# Altium footprint library My Footprint 3D.PCBLIB: 447 footprints (part 11 of 29)
Each footprint in its own frame and in the unit in brackets; x right, y up, seen from the top. Pads: shape width x height; smd on the part's side, far side on the other; paste and mask are expansions set on the pad; w line width, h text height; cw(c..) or ccw(c..) is an arc to the next point about the centre after c.
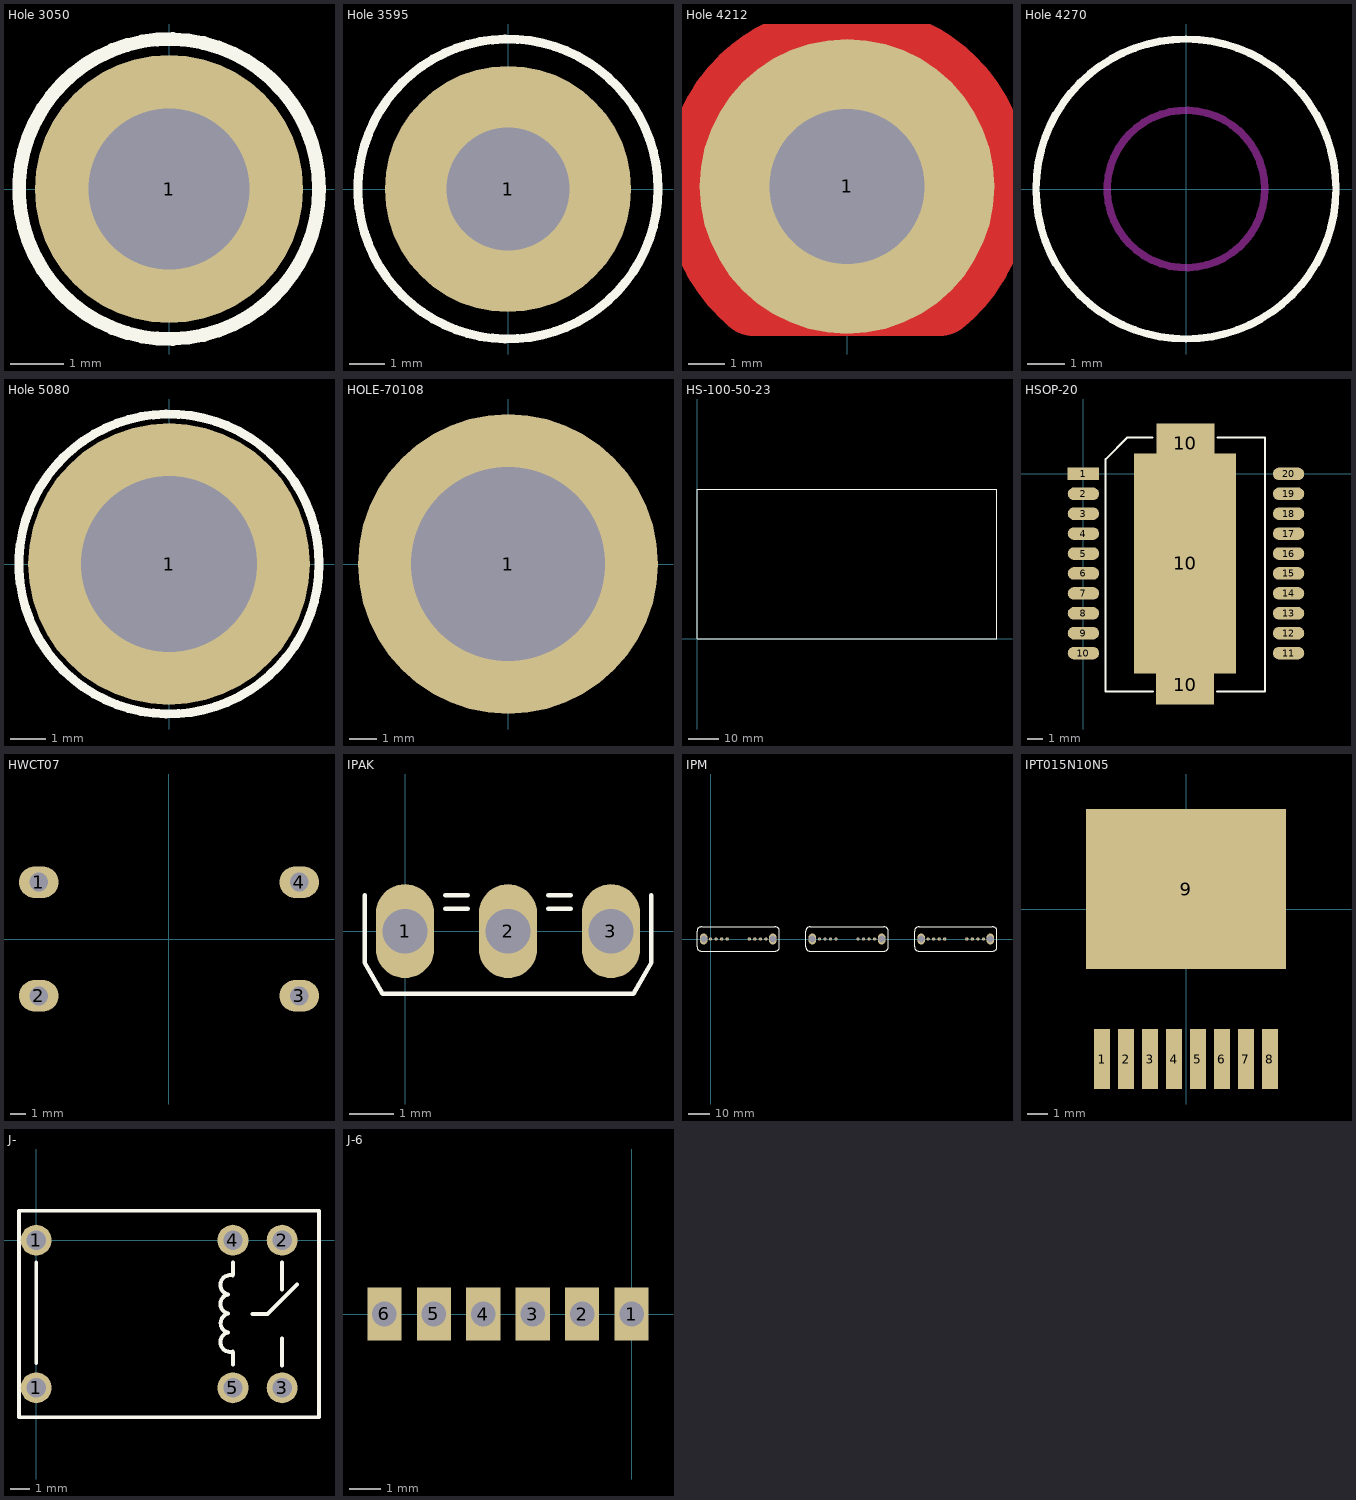
[diagram p10: the footprints below, top view; thin cyan lines are the x and y axes]

## Hole 3050 [mm] "3mm"
pads (1):
  round 5 hole 3: 1(0,0)
Top Overlay:
  circle w0.254: c0,0 r2.794

## Hole 3595 [mm] "Hole 3.5mm"
pads (1):
  round 7 hole 3.5: 1(0,0)
Top Overlay:
  circle w0.254: c0,0 r4.26

## Hole 4212 [mm]
pads (1):
  round 8 hole 4.2: 1(0,0)
Top Layer:
  rectangle: -2.54,-4.064 2.54,-2.54
  lines w2.06: -2.52,-3.024 cw(c0,0) 2.507,-3.035
Top Solder:
  rectangle: -2.413,-4.14 2.667,-2.592
  lines w3: -2.379,-2.643 cw(c0,0) 2.379,-2.643

## Hole 4270 [mm]
Top Overlay:
  circle w0.2: c0,0 r4
Keep-Out Layer:
  circle w0.2: c0,0 r2.1

## Hole 5080 [mm]
pads (1):
  round 8 hole 5: 1(0,0)
Top Overlay:
  circle w0.254: c0,0 r4.26

## HOLE-70108 [mm]
pads (1):
  round 10.8 hole 7: 1(0,0)

## HS-100-50-23 [mm]
Top Overlay:
  lines w0.254: 0,0 0,50 100,50 100,0 0,0
3D body: height 27.5, standoff 7.5, extent 0,48.5 100,50
3D body: height 27.5, standoff 7.5, extent 0.025,44.1 100.025,45.6
3D body: height 27.5, standoff 7.5, extent 0.025,39.625 100.025,41.125
3D body: height 27.5, standoff 7.5, extent 0.025,35.6 100.025,37.1
3D body: height 27.5, standoff 7.5, extent 0,31.5 100,33
3D body: height 27.5, standoff 7.5, extent 0,27 100,28.5
3D body: height 27.5, standoff 7.5, extent 0,22.5 100,24
3D body: height 27.5, standoff 7.5, extent 0,18 100,19.5
3D body: height 27.5, standoff 7.5, extent 0,13.5 100,15
3D body: height 27.5, standoff 7.5, extent 0,9 100,10.5
3D body: height 27.5, standoff 7.5, extent 0,4.5 100,6
3D body: height 27.5, standoff 7.5, extent 0,0 100,1.5
3D body: height 7.5, standoff 4.5, extent 0,0 100,50

## HS-180-35-30 [mm]
3D body: height 35, standoff 32, extent 0,5 180,35
3D body: height 26.4, standoff 23.4, extent 0,5 180,35
3D body: height 18.6, standoff 15.6, extent 0,5 180,35
3D body: height 10.8, standoff 7.8, extent 0,5 180,35
3D body: height 3, standoff 0, extent 0,5 180,35
3D body: height 35, standoff 0, extent 0,0 180,5

## HS-250-72-30 [mm]
3D body: height 45, standoff 15, extent 0,69 250,72
3D body: height 45, standoff 15, extent 0,59 250,62
3D body: height 45, standoff 15, extent 0,49 250,52
3D body: height 45, standoff 15, extent 0,39 250,42
3D body: height 45, standoff 15, extent 0,29 250,32
3D body: height 45, standoff 15, extent 0,19 250,22
3D body: height 45, standoff 15, extent 0,9 250,12
3D body: height 45, standoff 15, extent 0,0 250,3
3D body: height 19.8, standoff 15, extent 0,0 250,72

## HSOP-20 [mm]
pads (23):
  rect 2x0.8 smd: 1(0,0)
  oval 2x0.8 smd: 2(0,-1.27) 3(0,-2.54) 4(0,-3.81) 5(0,-5.08) 6(0,-6.35) 7(0,-7.62) 8(0,-8.89) 9(0,-10.16) 10(0,-11.43) 11(13.081,-11.43) 12(13.081,-10.16) 13(13.081,-8.89) 14(13.081,-7.62) 15(13.081,-6.35) 16(13.081,-5.08) 17(13.081,-3.81) 18(13.081,-2.54) 19(13.081,-1.27) 20(13.081,0)
  rect 3.7x2.5 smd: 10(6.477,-13.462) 10(6.496,1.968)
  rect 6.5x14 smd: 10(6.477,-5.715)
Top Overlay:
  lines w0.127: 4.41,2.321 2.794,2.321 1.416,0.943 1.416,-13.879 4.445,-13.879 ; 8.509,-13.879 11.576,-13.879 11.576,2.321 8.544,2.321

## HWCT07 [mm]
pads (4):
  oval 2.5x2 hole 1.2: 1(-8.25,3.6) 2(-8.25,-3.6) 3(8.25,-3.6) 4(8.25,3.6)
3D body: height 19.8, standoff 0, extent -10,-5.5 10,5.5
3D body: height 0, standoff -2, extent 7.853,3.201 8.65,3.999
3D body: height 0, standoff -2, extent 7.853,-3.999 8.65,-3.201
3D body: height 0, standoff -2, extent -8.647,-3.999 -7.85,-3.201
3D body: height 0, standoff -2, extent -8.647,3.201 -7.85,3.999

## IPAK [mm]
pads (3):
  oval 1.3x2.1 hole 1: 1(0,0) 2(2.3,0) 3(4.6,0)
Top Overlay:
  lines w0.1: -0.9,0.8 -0.9,-0.7 -0.5,-1.4 5.1,-1.4 5.5,-0.7 5.5,0.8 ; 0.9,0.5 1.4,0.5 ; 0.9,0.8 1.4,0.8 ; 3.2,0.5 3.7,0.5 ; 3.2,0.8 3.7,0.8
3D body: height 4, standoff -2, extent 4.2,-0.25 5,0.25
3D body: height 4, standoff -2, extent -0.4,-0.25 0.4,0.25
3D body: height 4, standoff -2, extent 1.9,-0.25 2.7,0.25
3D body: height 8.8, standoff 8.6, extent 4.2,0.625 5,1.025
3D body: height 8.8, standoff 8.6, extent -0.4,0.625 0.4,1.025
3D body: height 8.6, standoff 7.4, extent -0.4,0.625 5,1.025
3D body: height 7.4, standoff 3.4, extent -0.1,0.625 4.7,1.025
3D body: height 7.4, standoff 1.2, extent -1,-1.5 5.6,1

## IPM [mm]
pads (30):
  round 1.5 hole 0.8: 1(0,0) 2(2.54,0) 3(5.08,0) 4(7.62,0) 5(17.78,0) 6(20.32,0) 7(22.86,0) 8(25.4,0) 9(50.013,0) 10(52.553,0) 11(55.093,0) 12(57.633,0) 13(67.793,0) 14(70.333,0) 15(72.873,0) 16(75.413,0) 17(100,0) 18(102.54,0) 19(105.08,0) 20(107.62,0) 21(117.78,0) 22(120.32,0) 23(122.86,0) 24(125.4,0)
  oval 3.5x5 hole 3: ""(-3.226,0) ""(28.626,0) ""(46.787,0) ""(78.638,0) ""(96.774,0) ""(128.626,0)
Top Overlay:
  lines w0.2: -6.263,-3.556 ccw(c-4.237,-3.568) -4.191,-5.593 29.591,-5.593 ccw(c29.637,-3.568) 31.663,-3.556 31.663,3.556 ccw(c29.637,3.568) 29.591,5.593 -4.191,5.593 ccw(c-4.237,3.568) -6.263,3.556 -6.263,-3.556 ; 43.75,-3.556 ccw(c45.776,-3.568) 45.822,-5.593 79.603,-5.593 ccw(c79.65,-3.568) 81.675,-3.556 81.675,3.556 ccw(c79.65,3.568) 79.603,5.593 45.822,5.593 ccw(c45.776,3.568) 43.75,3.556 43.75,-3.556 ; 93.737,-3.556 ccw(c95.763,-3.568) 95.809,-5.593 129.591,-5.593 ccw(c129.637,-3.568) 131.662,-3.556 131.662,3.556 ccw(c129.637,3.568) 129.591,5.593 95.809,5.593 ccw(c95.763,3.568) 93.737,3.556 93.737,-3.556

## IPT015N10N5 [mm]
pads (9):
  rrect10% 0.8x3 smd: 1(-4.2,-7.5) 2(-3,-7.5) 3(-1.8,-7.5) 4(-0.6,-7.5) 5(0.6,-7.5) 6(1.8,-7.5) 7(3,-7.5) 8(4.2,-7.5)
  rect 10x8 smd: 9(0,1)
Top Solder:
  region: -3.5,-6 -3.5,-7 4.7,-7 4.7,-6
3D body "User Library-PG-HSOF-8-1.step": height 2.8, standoff 0.5, extent -5,-7.838 4.9,3.838

## J- [mm]
pads (6):
  round 1.6 hole 1: 1(0,-7.62) 1(0,0) 2(12.7,0) 3(12.7,-7.62) 4(10.16,0) 5(10.16,-7.62)
Top Overlay:
  lines w0.2: 0,-6.35 0,-1.143 ; 9.902,-4.771 cw(c10.035,-4.28) 9.912,-3.788 cw(c10.019,-3.291) 9.904,-2.797 ; 9.903,-4.767 ccw(c10.019,-5.262) 10.149,-5.753 ; 9.905,-2.8 cw(c10.02,-2.306) 10.15,-1.814 ; 10.158,-6.424 10.158,-5.789 ; 10.16,-1.778 10.16,-1.143 ; 11.176,-3.81 11.938,-3.81 13.462,-2.286 ; 12.7,-6.477 12.7,-5.08 ; 12.7,-2.54 12.7,-1.143 ; -0.889,-9.144 14.605,-9.144 14.605,1.524 -0.889,1.524 -0.889,-9.144

## J-6 [mm]
pads (6):
  rect 1.1x1.7 hole 0.8: 1(0,0) 2(-1.6,0) 3(-3.2,0) 4(-4.8,0) 5(-6.4,0) 6(-8,0)